# Altium footprint library Dr.Xiong_20160818.PcbLib: 266 footprints (part 14 of 17)
Each footprint in its own frame and in the unit in brackets; x right, y up, seen from the top. Pads: shape width x height; smd on the part's side, far side on the other; paste and mask are expansions set on the pad; w line width, h text height; cw(c..) or ccw(c..) is an arc to the next point about the centre after c.
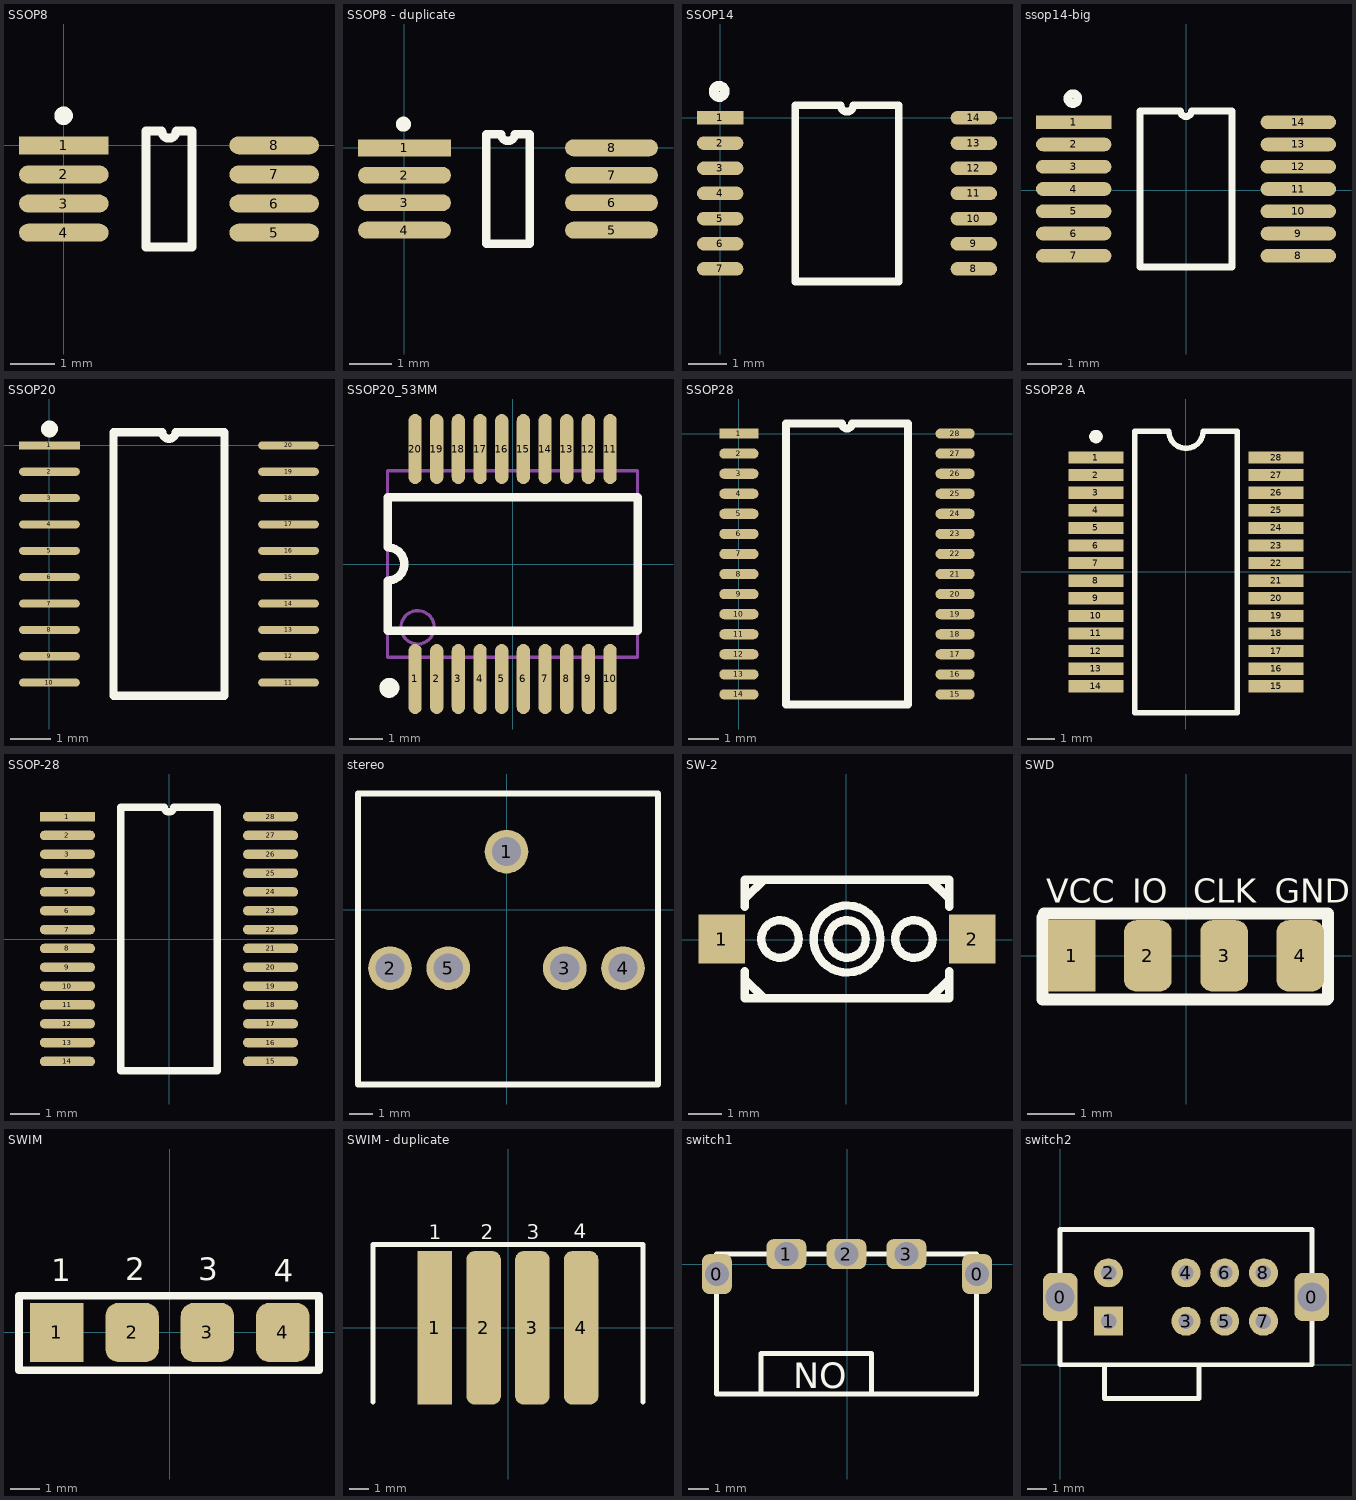
[diagram p13: the footprints below, top view; thin cyan lines are the x and y axes]

## SSOP8 [mm]
pads (8):
  rect 2x0.4 smd: 1(0,0)
  oval 2x0.4 smd: 2(0,-0.65) 3(0,-1.3) 4(0,-1.95) 5(4.7,-1.95) 6(4.7,-1.3) 7(4.7,-0.65) 8(4.7,0)
Top Overlay:
  circle w0.254: c-0.004,0.66 r0.08
  lines w0.2: 1.835,-2.275 2.865,-2.275 2.865,0.325 2.512,0.325 cw(c2.35,0.325) 2.188,0.325 1.835,0.325 1.835,-2.275

## SSOP8 - duplicate [mm]
pads (8):
  rect 2.2x0.4 smd: 1(0,0)
  oval 2.2x0.4 smd: 2(0,-0.65) 3(0,-1.3) 4(0,-1.95) 5(4.9,-1.95) 6(4.9,-1.3) 7(4.9,-0.65) 8(4.9,0)
Top Overlay:
  circle w0.254: c-0.025,0.559 r0.051
  lines w0.2: 1.935,-2.275 2.965,-2.275 2.965,0.325 2.612,0.325 cw(c2.45,0.325) 2.288,0.325 1.935,0.325 1.935,-2.275

## SSOP14 [mm]
pads (14):
  rect 1.2x0.35 smd: 1(0,0)
  oval 1.2x0.35 smd: 2(0,-0.65) 3(0,-1.3) 4(0,-1.95) 5(0,-2.6) 6(0,-3.251) 7(0,-3.9) 8(6.55,-3.9) 9(6.55,-3.25) 10(6.55,-2.6) 11(6.55,-1.95) 12(6.55,-1.3) 13(6.55,-0.65) 14(6.55,0)
Top Overlay:
  circle w0.254: c-0.025,0.686 r0.144
  lines w0.2: 1.935,-4.225 1.935,0.325 3.113,0.325 ccw(c3.275,0.325) 3.437,0.325 4.615,0.325 4.615,-4.225 1.935,-4.225

## ssop14-big [mm]
pads (14):
  rect 2.2x0.4 smd: 1(-3.277,1.986)
  oval 2.2x0.4 smd: 2(-3.277,1.336) 3(-3.277,0.686) 4(-3.277,0.036) 5(-3.277,-0.614) 6(-3.277,-1.264) 7(-3.277,-1.914) 8(3.273,-1.914) 9(3.273,-1.264) 10(3.273,-0.614) 11(3.273,0.036) 12(3.273,0.686) 13(3.273,1.336) 14(3.273,1.986)
Top Overlay:
  circle w0.254: c-3.302,2.672 r0.144
  lines w0.2: -1.342,-2.239 1.338,-2.239 1.338,2.311 0.161,2.311 cw(c-0.002,2.311) -0.164,2.311 -1.342,2.311 -1.342,-2.239

## SSOP20 [mm]
pads (20):
  rect 1.5x0.2 smd: 1(0,0)
  oval 1.5x0.2 smd: 2(0,-0.65) 3(0,-1.3) 4(0,-1.95) 5(0,-2.6) 6(0,-3.25) 7(0,-3.9) 8(0,-4.55) 9(0,-5.2) 10(0,-5.85) 11(5.9,-5.85) 12(5.9,-5.2) 13(5.9,-4.55) 14(5.9,-3.9) 15(5.9,-3.25) 16(5.9,-2.6) 17(5.9,-1.95) 18(5.9,-1.3) 19(5.9,-0.65) 20(5.9,0)
Top Overlay:
  circle w0.254: c0,0.406 r0.08
  lines w0.2: 1.585,-6.175 4.315,-6.175 4.315,0.325 3.112,0.325 cw(c2.95,0.325) 2.788,0.325 1.585,0.325 1.585,-6.175

## SSOP20_53MM [mm]
pads (20):
  oval 0.4x2.1 smd mask+0.051: 1(-2.925,-3.45) 2(-2.275,-3.45) 3(-1.625,-3.45) 4(-0.975,-3.45) 5(-0.325,-3.45) 6(0.325,-3.45) 7(0.975,-3.45) 8(1.625,-3.45) 9(2.275,-3.45) 10(2.925,-3.45) 11(2.925,3.45) 12(2.275,3.45) 13(1.625,3.45) 14(0.975,3.45) 15(0.325,3.45) 16(-0.325,3.45) 17(-0.975,3.45) 18(-1.625,3.45) 19(-2.275,3.45) 20(-2.925,3.45)
Top Overlay:
  circle w0.3: c-3.697,-3.715 r0.15
  lines w0.254: -3.75,-2 -3.75,-0.5 ccw(c-3.75,0) -3.75,0.5 -3.75,2 3.75,2 3.75,-2 -3.75,-2
Mechanical 13:
  circle w0.1: c-2.85,-1.9 r0.5
  lines w0.1: -3.75,-2.8 3.75,-2.8 3.75,2.8 -3.75,2.8 -3.75,-2.8

## SSOP28 [mil]
pads (28):
  rect 50x13 smd: 1(0,0)
  oval 50x13 smd: 2(0,-25.6) 3(0,-51.2) 4(0,-76.8) 5(0,-102.4) 6(0,-128) 7(0,-153.6) 8(0,-179.2) 9(0,-204.8) 10(0,-230.4) 11(0,-256) 12(0,-281.6) 13(0,-307.2) 14(0,-332.8) 15(276,-332.8) 16(276,-307.2) 17(276,-281.6) 18(276,-256) 19(276,-230.4) 20(276,-204.8) 21(276,-179.2) 22(276,-153.6) 23(276,-128) 24(276,-102.4) 25(276,-76.8) 26(276,-51.2) 27(276,-25.6) 28(276,0)
Top Overlay:
  lines w10: 60,-345.6 216,-345.6 216,12.8 144.4,12.8 cw(c138,12.8) 131.6,12.8 60,12.8 60,-345.6

## SSOP28 A [mm]
pads (28):
  rect 2.05x0.45 smd: 1(-3.325,4.225) 2(-3.325,3.575) 3(-3.325,2.925) 4(-3.325,2.275) 5(-3.325,1.625) 6(-3.325,0.975) 7(-3.325,0.325) 8(-3.325,-0.325) 9(-3.325,-0.975) 10(-3.325,-1.625) 11(-3.325,-2.275) 12(-3.325,-2.925) 13(-3.325,-3.575) 14(-3.325,-4.225) 15(3.325,-4.225) 16(3.325,-3.575) 17(3.325,-2.925) 18(3.325,-2.275) 19(3.325,-1.625) 20(3.325,-0.975) 21(3.325,-0.325) 22(3.325,0.325) 23(3.325,0.975) 24(3.325,1.625) 25(3.325,2.275) 26(3.325,2.925) 27(3.325,3.575) 28(3.325,4.225)
Top Overlay:
  circle w0.25: c-3.325,5 r0.125
  lines w0.2: -1.9,-5.2 1.9,-5.2 1.9,5.2 0.633,5.2 cw(c0,5.2) -0.633,5.2 -1.9,5.2 -1.9,-5.2

## SSOP-28 [mil]
pads (28):
  rect 75x13 smd: 1(-138,166.4)
  oval 75x13 smd: 2(-138,140.8) 3(-138,115.2) 4(-138,89.6) 5(-138,64) 6(-138,38.4) 7(-138,12.8) 8(-138,-12.8) 9(-138,-38.4) 10(-138,-64) 11(-138,-89.6) 12(-138,-115.2) 13(-138,-140.8) 14(-138,-166.4) 15(138,-166.4) 16(138,-140.8) 17(138,-115.2) 18(138,-89.6) 19(138,-64) 20(138,-38.4) 21(138,-12.8) 22(138,12.8) 23(138,38.4) 24(138,64) 25(138,89.6) 26(138,115.2) 27(138,140.8) 28(138,166.4)
Top Overlay:
  lines w10: -65.5,-179.2 65.5,-179.2 65.5,179.2 6.4,179.2 cw(c0,179.2) -6.4,179.2 -65.5,179.2 -65.5,-179.2

## stereo [mm]
pads (5):
  round 1.905 hole 1.27: 1(0,2.54) 2(-5.08,-2.54) 3(2.54,-2.54) 4(5.08,-2.54) 5(-2.54,-2.54)
Top Overlay:
  lines w0.254: -6.477,-7.62 -6.477,5.08 0,5.08 6.604,5.08 6.604,-7.62 -6.477,-7.62

## SW-2 [mm]
pads (2):
  rect 1.4x1.5 smd: 1(-3.77,0.022) 2(3.83,0.022)
Top Overlay:
  circle w0.254: c-2.002,0.022 r0.568
  circle w0.254: c2.062,0.022 r0.568
  circle w0.254: c0.03,0.022 r1.016
  circle w0.254: c0.03,0.022 r0.568
  lines w0.254: -3.07,-0.959 -3.07,-1.778 3.129,-1.778 3.129,-0.959 ; -3.07,1.003 -3.07,1.822 3.129,1.822 3.129,1.003 ; -3.018,-1.248 -2.51,-1.756 ; -3.018,1.292 -2.51,1.8 ; 2.57,-1.756 3.078,-1.248 ; 2.57,1.8 3.078,1.292
Mechanical 15:
  lines w0.003: 0.004,0.462 0.055,0.513

## SWD [mm]
pads (4):
  rect 1x1.5 smd: 1(-2.4,0)
  rrect50% 1x1.5 smd: 2(-0.8,0) 3(0.8,0) 4(2.4,0)
Top Overlay:
  lines w0.254: -3.01,0.813 -3.01,-0.914 2.959,-0.914 ; -2.984,0.889 2.984,0.889 2.984,-0.889
  text "GND" at 1.867,1.118 h0.51
  text "CLK" at 0.152,1.118 h0.51
  text "IO" at -1.13,1.118 h0.51
  text "VCC" at -2.934,1.118 h0.51

## SWIM [mm]
pads (4):
  rect 1.8x2 smd: 1(-3.81,0)
  rrect50% 1.8x2 smd: 2(-1.27,0) 3(1.27,0) 4(3.81,0)
Top Overlay:
  lines w0.254: 5.029,0.838 5.029,1.245 -5.08,1.245 -5.08,-1.27 5.029,-1.27 5.029,1.118
  text "4" at 3.505,1.702 h0.76
  text "3" at 0.965,1.753 h0.76
  text "2" at -1.499,1.753 h0.76
  text "1" at -3.988,1.727 h0.76

## SWIM - duplicate [mm]
pads (4):
  rect 1.8x8 smd: 1(-3.81,0)
  rrect50% 1.8x8 smd: 2(-1.27,0) 3(1.27,0) 4(3.81,0)
Top Overlay:
  lines w0.254: -7.036,-3.861 -7.036,4.343 -5.131,4.343 ; -5.156,4.343 4.953,4.343 ; 4.851,4.343 5.08,4.343 7.036,4.343 7.036,-3.861
  text "4" at 3.429,4.674 h0.76
  text "3" at 0.965,4.623 h0.76
  text "2" at -1.422,4.623 h0.76
  text "1" at -4.115,4.597 h0.76

## switch1 [mm]
pads (5):
  rrect50% 1.5x2 hole 1.2: 0(-6.502,-0.5) 0(6.502,-0.5)
  rrect50% 2x1.5 hole 1.2: 1(-3.028,0.5) 2(-0.028,0.5) 3(2.972,0.5)
Top Overlay:
  lines w0.254: -4.293,-6.475 -4.293,-4.47 1.219,-4.47 1.219,-6.5 ; -6.528,-6.5 -6.528,0.5 6.472,0.5 6.472,-6.5 -6.528,-6.5
  text "NO" at -2.692,-6.223 h1.27

## switch2 [mm]
pads (10):
  rrect50% 1.8x2.5 hole 1.5: 0(0,3.5) 0(13,3.5)
  rect 1.5x1.5 hole 0.8: 1(2.5,2.25)
  round 1.5 hole 0.8: 2(2.5,4.75) 3(6.5,2.25) 4(6.5,4.75) 5(8.5,2.25) 6(8.5,4.75) 7(10.5,2.25) 8(10.5,4.75)
Top Overlay:
  lines w0.254: 2.286,-0.051 2.286,-1.753 7.163,-1.753 7.163,-0.051 ; 0,0 0,7 13,7 13,0 0,0